# Altium footprint library WR-TBL_Wire Protector.PcbLib: 120 footprints (part 4 of 8)
Each footprint in its own frame and in the unit in brackets; x right, y up, seen from the top. Pads: shape width x height; smd on the part's side, far side on the other; paste and mask are expansions set on the pad; w line width, h text height; cw(c..) or ccw(c..) is an arc to the next point about the centre after c.
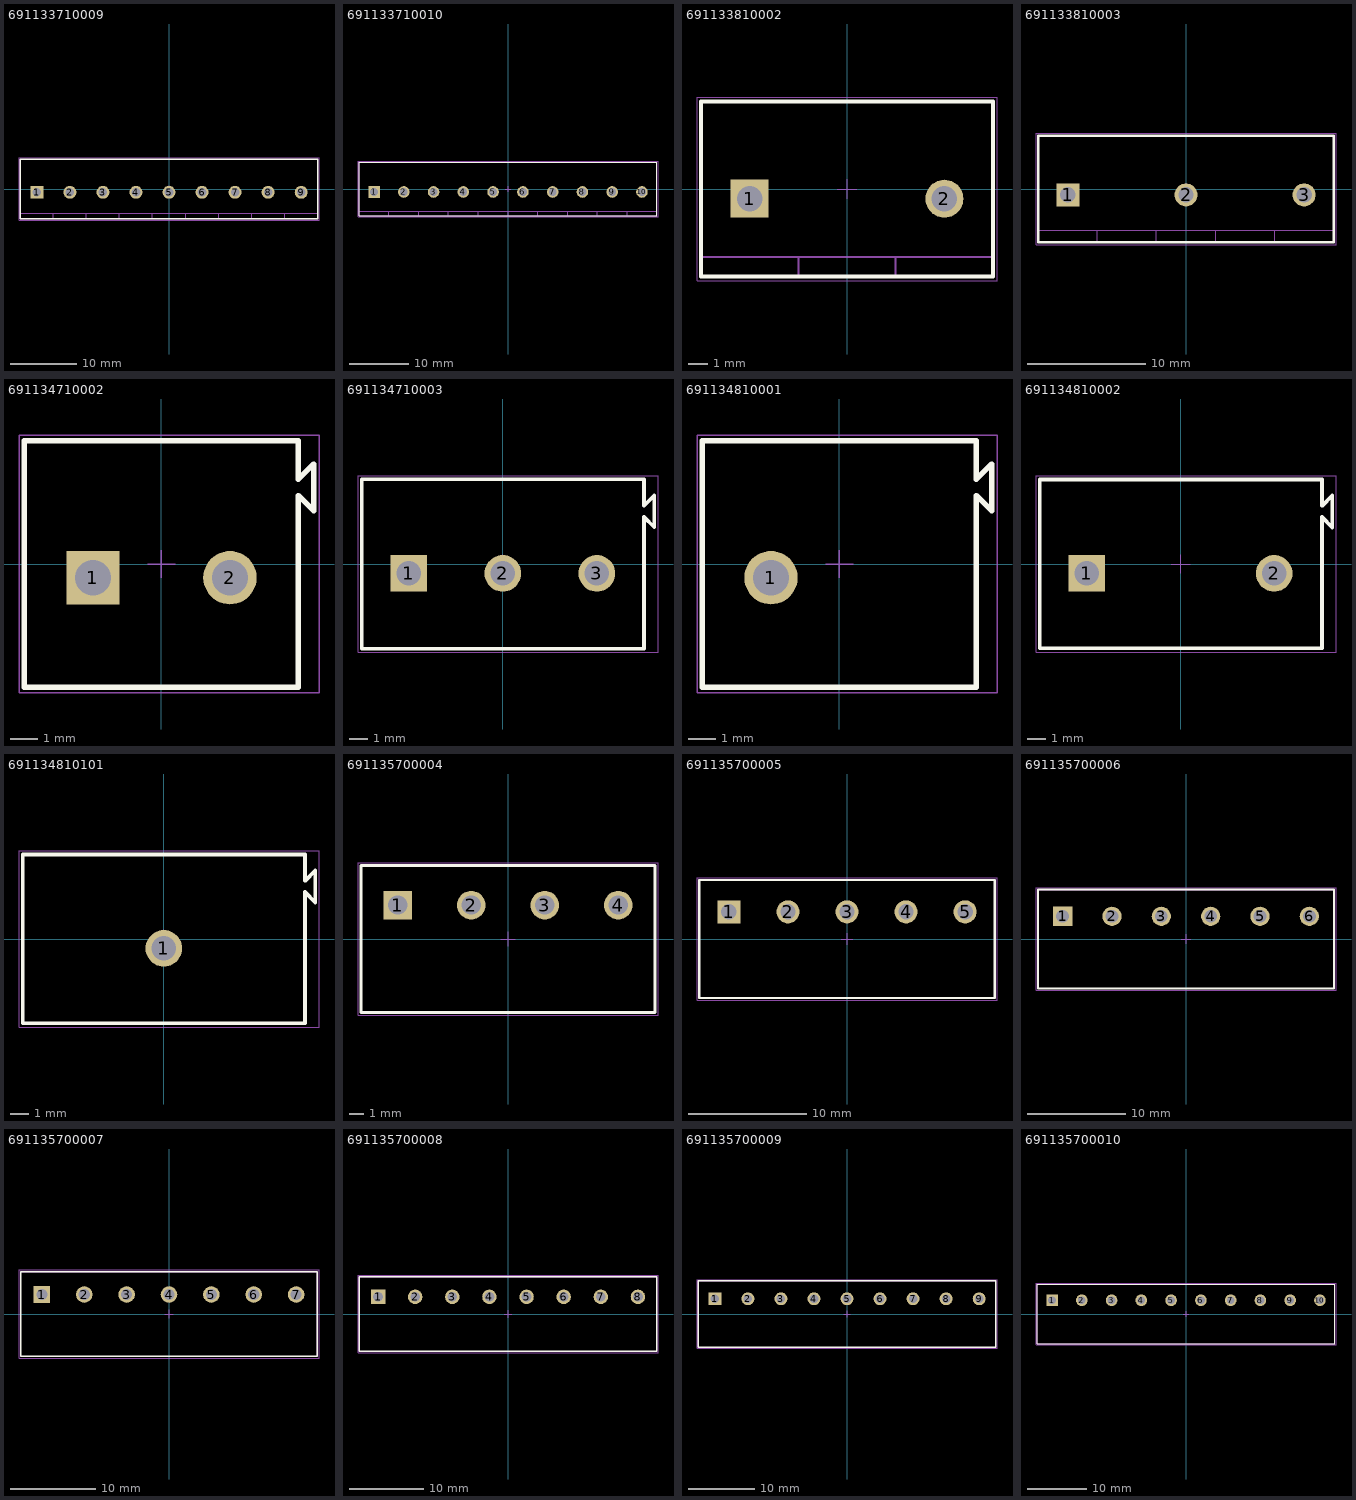
[diagram p3: the footprints below, top view; thin cyan lines are the x and y axes]

## 691133710009 [mm] "Serie 1337 - 5.00 mm_9 pins"
height 13
pads (9):
  rect 1.95x1.95 hole 1.3: 1(-20,-0.5)
  round 1.95 hole 1.3: 2(-15,-0.5) 3(-10,-0.5) 4(-5,-0.5) 5(0,-0.5) 6(5,-0.5) 7(10,-0.5) 8(15,-0.5) 9(20,-0.5)
Top Overlay:
  lines w0.2: -22.5,-4.5 22.5,-4.5 22.5,4.5 -22.5,4.5 -22.5,-4.5
Mechanical 13:
  lines w0.1: -22.5,-3.7 22.5,-3.7 ; -17.5,-4.5 -17.5,-3.7 ; -12.5,-4.5 -12.5,-3.7 ; -7.5,-4.5 -7.5,-3.7 ; -2.5,-4.5 -2.5,-3.7 ; 2.5,-4.5 2.5,-3.7 ; 7.5,-4.5 7.5,-3.7 ; 12.5,-4.5 12.5,-3.7 ; 17.5,-4.5 17.5,-3.7 ; -22.5,-4.5 -22.5,4.5 22.5,4.5 22.5,-4.5 -22.5,-4.5
Mechanical 15:
  lines w0.05: -0.5,0 0.5,0 ; 0,-0.5 0,0.5 ; -22.7,-4.7 22.7,-4.7 22.7,4.7 -22.7,4.7 -22.7,-4.7
3D body "691133710009.stp": height 13.1, standoff -3.5, extent -22.5,-4.5 22.5,4.5

## 691133710010 [mm] "Serie 1337 - 5.00 mm_10 pins"
height 13
pads (10):
  rect 1.95x1.95 hole 1.3: 1(-22.5,-0.5)
  round 1.95 hole 1.3: 2(-17.5,-0.5) 3(-12.5,-0.5) 4(-7.5,-0.5) 5(-2.5,-0.5) 6(2.5,-0.5) 7(7.5,-0.5) 8(12.5,-0.5) 9(17.5,-0.5) 10(22.5,-0.5)
Top Overlay:
  lines w0.2: -25,-4.5 -25,4.5 25,4.5 25,-4.5 -25,-4.5
Mechanical 13:
  lines w0.1: -25,-3.7 25,-3.7 ; -20,-4.5 -20,-3.7 ; -15,-4.5 -15,-3.7 ; -10,-4.5 -10,-3.7 ; -5,-4.5 -5,-3.7 ; 0,-4.5 0,-3.7 ; 5,-4.5 5,-3.7 ; 10,-4.5 10,-3.7 ; 15,-4.5 15,-3.7 ; 20,-4.5 20,-3.7 ; -25,-4.5 25,-4.5 25,4.5 -25,4.5 -25,-4.5
Mechanical 15:
  lines w0.05: -0.5,0 0.5,0 ; 0,-0.5 0,0.5 ; -25.2,-4.7 -25.2,4.7 25.2,4.7 25.2,-4.7 -25.2,-4.7
3D body "691133710010.stp": height 13.1, standoff -3.5, extent -25,-4.5 25,4.5

## 691133810002 [mm] "Serie 1338 - 10.00 mm_2 pins"
height 13
pads (2):
  rect 1.95x1.95 hole 1.3: 1(-5,-0.5)
  round 1.95 hole 1.3: 2(5,-0.5)
Top Overlay:
  lines w0.2: -7.5,-4.5 -7.5,4.5 7.5,4.5 7.5,-4.5 -7.5,-4.5
Mechanical 13:
  lines w0.1: -7.5,-3.5 7.5,-3.5 ; -2.5,-4.5 -2.5,-3.5 ; 2.5,-4.5 2.5,-3.5 ; -7.5,-4.5 7.5,-4.5 7.5,4.5 -7.5,4.5 -7.5,-4.5
Mechanical 15:
  lines w0.05: -0.5,0 0.5,0 ; 0,-0.5 0,0.5 ; -7.7,-4.7 -7.7,4.7 7.7,4.7 7.7,-4.7 -7.7,-4.7
3D body "691133810002.stp": height 13.1, standoff -3.5, extent -7.5,-4.5 7.5,4.5

## 691133810003 [mm] "Serie 1338 - 10.00 mm_3 pins"
height 13
pads (3):
  rect 1.95x1.95 hole 1.3: 1(-10,-0.5)
  round 1.95 hole 1.3: 2(0,-0.5) 3(10,-0.5)
Top Overlay:
  lines w0.2: -12.5,-4.5 -12.5,4.5 12.5,4.5 12.5,-4.5 -12.5,-4.5
Mechanical 13:
  lines w0.1: -12.5,-3.5 12.5,-3.5 ; -7.5,-4.5 -7.5,-3.5 ; -2.5,-4.5 -2.5,-3.5 ; 2.5,-4.5 2.5,-3.5 ; 7.5,-4.5 7.5,-3.5 ; -12.5,-4.5 12.5,-4.5 12.5,4.5 -12.5,4.5 -12.5,-4.5
Mechanical 15:
  lines w0.05: -0.5,0 0.5,0 ; 0,-0.5 0,0.5 ; -12.7,-4.7 -12.7,4.7 12.7,4.7 12.7,-4.7 -12.7,-4.7
3D body "691133810003.stp": height 13.1, standoff -3.5, extent -12.5,-4.5 12.5,4.5

## 691134710002 [mm] "Serie 1347 - 5.00 mm_2 pins"
height 13
pads (2):
  rect 1.95x1.95 hole 1.3: 1(-2.5,-0.5)
  round 1.95 hole 1.3: 2(2.5,-0.5)
Top Overlay:
  lines w0.2: -5,-4.5 5,-4.5 5,2.5 5.55,1.95 5.55,3.65 5,3.1 5,4.5 -5,4.5 -5,-4.5
Mechanical 13:
  lines w0.1: -5,-4.5 -5,4.5 5,4.5 5,3.1 5.55,3.65 5.55,1.95 5,2.5 5,-4.5 -5,-4.5
Mechanical 15:
  lines w0.05: -0.5,0 0.5,0 ; 0,-0.5 0,0.5 ; -5.2,-4.7 5.75,-4.7 5.75,4.7 -5.2,4.7 -5.2,-4.7
3D body "691134710002.stp": height 13.1, standoff -3.9, extent -5,-4.5 5.55,4.5

## 691134710003 [mm] "Serie 1347 - 5.00 mm_3 pins"
height 13
pads (3):
  rect 1.95x1.95 hole 1.3: 1(-5,-0.5)
  round 1.95 hole 1.3: 2(0,-0.5) 3(5,-0.5)
Top Overlay:
  lines w0.2: -7.5,-4.5 7.5,-4.5 7.5,2.5 8.05,1.95 8.05,3.65 7.5,3.1 7.5,4.5 -7.5,4.5 -7.5,-4.5
Mechanical 13:
  lines w0.1: -7.5,-4.5 -7.5,4.5 7.5,4.5 7.5,3.1 8.05,3.65 8.05,1.95 7.5,2.5 7.5,-4.5 -7.5,-4.5
Mechanical 15:
  lines w0.05: -0.5,0 0.5,0 ; 0,-0.5 0,0.5 ; -7.7,-4.7 8.25,-4.7 8.25,4.7 -7.7,4.7 -7.7,-4.7
3D body "691134710003.stp": height 13.1, standoff -3.9, extent -7.5,-4.5 8.05,4.5

## 691134810001 [mm] "Serie 1348 - 10.00 mm _1 pin"
height 13
pads (1):
  round 1.95 hole 1.3: 1(-2.5,-0.5)
Top Overlay:
  lines w0.2: -5,-4.5 -5,4.5 5,4.5 5,3.1 5.55,3.65 5.55,1.95 5,2.5 5,-4.5 -5,-4.5
Mechanical 13:
  lines w0.1: -5,-4.5 5,-4.5 5,2.5 5.55,1.95 5.55,3.65 5,3.1 5,4.5 -5,4.5 -5,-4.5
Mechanical 15:
  lines w0.05: -0.5,0 0.5,0 ; 0,-0.5 0,0.5 ; -5.2,-4.7 -5.2,4.7 5.75,4.7 5.75,-4.7 -5.2,-4.7
3D body "691134810001.stp": height 13.1, standoff -3.9, extent -4.95,-4.5 5.6,4.5

## 691134810002 [mm] "Serie 1348 - 10.00 mm _2 pins"
height 13
pads (2):
  rect 1.95x1.95 hole 1.3: 1(-5.025,-0.5)
  round 1.95 hole 1.3: 2(4.975,-0.5)
Top Overlay:
  lines w0.2: -7.525,-4.5 7.525,-4.5 7.525,2.5 8.075,1.95 8.075,3.65 7.525,3.1 7.525,4.5 -7.525,4.5 -7.525,-4.5
Mechanical 13:
  lines w0.1: -7.525,-4.5 -7.525,4.5 7.525,4.5 7.525,3.1 8.075,3.65 8.075,1.95 7.525,2.5 7.525,-4.5 -7.525,-4.5
Mechanical 15:
  lines w0.05: -0.5,0 0.5,0 ; 0,-0.5 0,0.5 ; -7.725,-4.7 -7.725,4.7 8.275,4.7 8.275,-4.7 -7.725,-4.7
3D body "691134810002.stp": height 13.1, standoff -3.9, extent -7.5,-4.5 8.05,4.5

## 691134810101 [mm] "Serie 1348 - 10.00 mm _1 pin"
height 13
pads (1):
  round 1.95 hole 1.3: 1(0,-0.5)
Top Overlay:
  lines w0.2: -7.525,-4.5 7.525,-4.5 7.525,2.5 8.075,1.95 8.075,3.65 7.525,3.1 7.525,4.5 -7.525,4.5 -7.525,-4.5
Mechanical 13:
  lines w0.1: -7.525,-4.5 -7.525,4.5 7.525,4.5 7.525,3.1 8.075,3.65 8.075,1.95 7.525,2.5 7.525,-4.5 -7.525,-4.5
Mechanical 15:
  lines w0.05: -0.5,0 0.5,0 ; 0,-0.5 0,0.5 ; -7.725,-4.7 -7.725,4.7 8.275,4.7 8.275,-4.7 -7.725,-4.7
3D body "691134810101.stp": height 13.1, standoff -3.9, extent -7.475,-4.5 8.075,4.5

## 691135700004 [mm] "Serie 1357 - 5.00 mm _ 4 pins"
height 7.5
pads (4):
  rect 1.95x1.95 hole 1.3: 1(-7.5,2.3)
  round 1.95 hole 1.3: 2(-2.5,2.3) 3(2.5,2.3) 4(7.5,2.3)
Top Overlay:
  lines w0.2: -10,-5 -10,5 10,5 10,-5 -10,-5
Mechanical 13:
  lines w0.1: -10,-5 10,-5 10,5 -10,5 -10,-5
Mechanical 15:
  lines w0.05: -0.5,0 0.5,0 ; 0,-0.5 0,0.5 ; -10.2,-5.2 -10.2,5.2 10.2,5.2 10.2,-5.2 -10.2,-5.2
3D body "691135700004.stp": height 7.6, standoff -3.6, extent -10,-5 10,5

## 691135700005 [mm] "Serie 1357 - 5.00 mm _ 5 pins"
height 7.5
pads (5):
  rect 1.95x1.95 hole 1.3: 1(-10,2.3)
  round 1.95 hole 1.3: 2(-5,2.3) 3(0,2.3) 4(5,2.3) 5(10,2.3)
Top Overlay:
  lines w0.2: -12.5,-5 -12.5,5 12.5,5 12.5,-5 -12.5,-5
Mechanical 13:
  lines w0.1: -12.5,-5 12.5,-5 12.5,5 -12.5,5 -12.5,-5
Mechanical 15:
  lines w0.05: -0.5,0 0.5,0 ; 0,-0.5 0,0.5 ; -12.7,-5.2 -12.7,5.2 12.7,5.2 12.7,-5.2 -12.7,-5.2
3D body "691135700005.stp": height 7.6, standoff -3.6, extent -12.5,-5 12.5,5

## 691135700006 [mm] "Serie 1357 - 5.00 mm _ 6 pins"
height 7.5
pads (6):
  rect 1.95x1.95 hole 1.3: 1(-12.5,2.3)
  round 1.95 hole 1.3: 2(-7.5,2.3) 3(-2.5,2.3) 4(2.5,2.3) 5(7.5,2.3) 6(12.5,2.3)
Top Overlay:
  lines w0.2: -15,-5 15,-5 15,5 -15,5 -15,-5
Mechanical 13:
  lines w0.1: -15,-5 -15,5 15,5 15,-5 -15,-5
Mechanical 15:
  lines w0.05: -0.5,0 0.5,0 ; 0,-0.5 0,0.5 ; -15.2,-5.2 15.2,-5.2 15.2,5.2 -15.2,5.2 -15.2,-5.2
3D body "691135700006.stp": height 7.6, standoff -3.6, extent -15,-5 15,5

## 691135700007 [mm] "Serie 1357 - 5.00 mm _ 7 pins"
height 7.5
pads (7):
  rect 1.95x1.95 hole 1.3: 1(-15,2.3)
  round 1.95 hole 1.3: 2(-10,2.3) 3(-5,2.3) 4(0,2.3) 5(5,2.3) 6(10,2.3) 7(15,2.3)
Top Overlay:
  lines w0.2: -17.5,-5 -17.5,5 17.5,5 17.5,-5 -17.5,-5
Mechanical 13:
  lines w0.1: -17.5,-5 17.5,-5 17.5,5 -17.5,5 -17.5,-5
Mechanical 15:
  lines w0.05: -0.5,0 0.5,0 ; 0,-0.5 0,0.5 ; -17.7,-5.2 -17.7,5.2 17.7,5.2 17.7,-5.2 -17.7,-5.2
3D body "691135700007.stp": height 7.6, standoff -3.6, extent -17.5,-5 17.5,5

## 691135700008 [mm] "Serie 1357 - 5.00 mm _ 8 pins"
height 7.5
pads (8):
  rect 1.95x1.95 hole 1.3: 1(-17.5,2.3)
  round 1.95 hole 1.3: 2(-12.5,2.3) 3(-7.5,2.3) 4(-2.5,2.3) 5(2.5,2.3) 6(7.5,2.3) 7(12.5,2.3) 8(17.5,2.3)
Top Overlay:
  lines w0.2: -20,-5 20,-5 20,5 -20,5 -20,-5
Mechanical 13:
  lines w0.1: -20,-5 -20,5 20,5 20,-5 -20,-5
Mechanical 15:
  lines w0.05: -0.5,0 0.5,0 ; 0,-0.5 0,0.5 ; -20.2,-5.2 20.2,-5.2 20.2,5.2 -20.2,5.2 -20.2,-5.2
3D body "691135700008.stp": height 7.6, standoff -3.6, extent -20,-5 20,5

## 691135700009 [mm] "Serie 1357 - 5.00 mm _ 9 pins"
height 7.5
pads (9):
  rect 1.95x1.95 hole 1.3: 1(-20,2.3)
  round 1.95 hole 1.3: 2(-15,2.3) 3(-10,2.3) 4(-5,2.3) 5(0,2.3) 6(5,2.3) 7(10,2.3) 8(15,2.3) 9(20,2.3)
Top Overlay:
  lines w0.2: -22.5,-5 -22.5,5 22.5,5 22.5,-5 -22.5,-5
Mechanical 13:
  lines w0.1: -22.5,-5 22.5,-5 22.5,5 -22.5,5 -22.5,-5
Mechanical 15:
  lines w0.05: -0.5,0 0.5,0 ; 0,-0.5 0,0.5 ; -22.7,-5.2 -22.7,5.2 22.7,5.2 22.7,-5.2 -22.7,-5.2
3D body "691135700009.stp": height 7.6, standoff -3.6, extent -22.5,-5 22.5,5

## 691135700010 [mm] "Serie 1357 - 5.00 mm _ 10 pins"
height 7.5
pads (10):
  rect 1.95x1.95 hole 1.3: 1(-22.5,2.3)
  round 1.95 hole 1.3: 2(-17.5,2.3) 3(-12.5,2.3) 4(-7.5,2.3) 5(-2.5,2.3) 6(2.5,2.3) 7(7.5,2.3) 8(12.5,2.3) 9(17.5,2.3) 10(22.5,2.3)
Top Overlay:
  lines w0.2: -25,-5 25,-5 25,5 -25,5 -25,-5
Mechanical 13:
  lines w0.1: -25,-5 -25,5 25,5 25,-5 -25,-5
Mechanical 15:
  lines w0.05: -0.5,0 0.5,0 ; 0,-0.5 0,0.5 ; -25.2,-5.2 25.2,-5.2 25.2,5.2 -25.2,5.2 -25.2,-5.2
3D body "691135700010.stp": height 7.6, standoff -3.6, extent -25,-5 25,5